# Altium footprint library C210_Rev_B_220601.PcbLib: 80 footprints (part 3 of 5)
Each footprint in its own frame and in the unit in brackets; x right, y up, seen from the top. Pads: shape width x height; smd on the part's side, far side on the other; paste and mask are expansions set on the pad; w line width, h text height; cw(c..) or ccw(c..) is an arc to the next point about the centre after c.
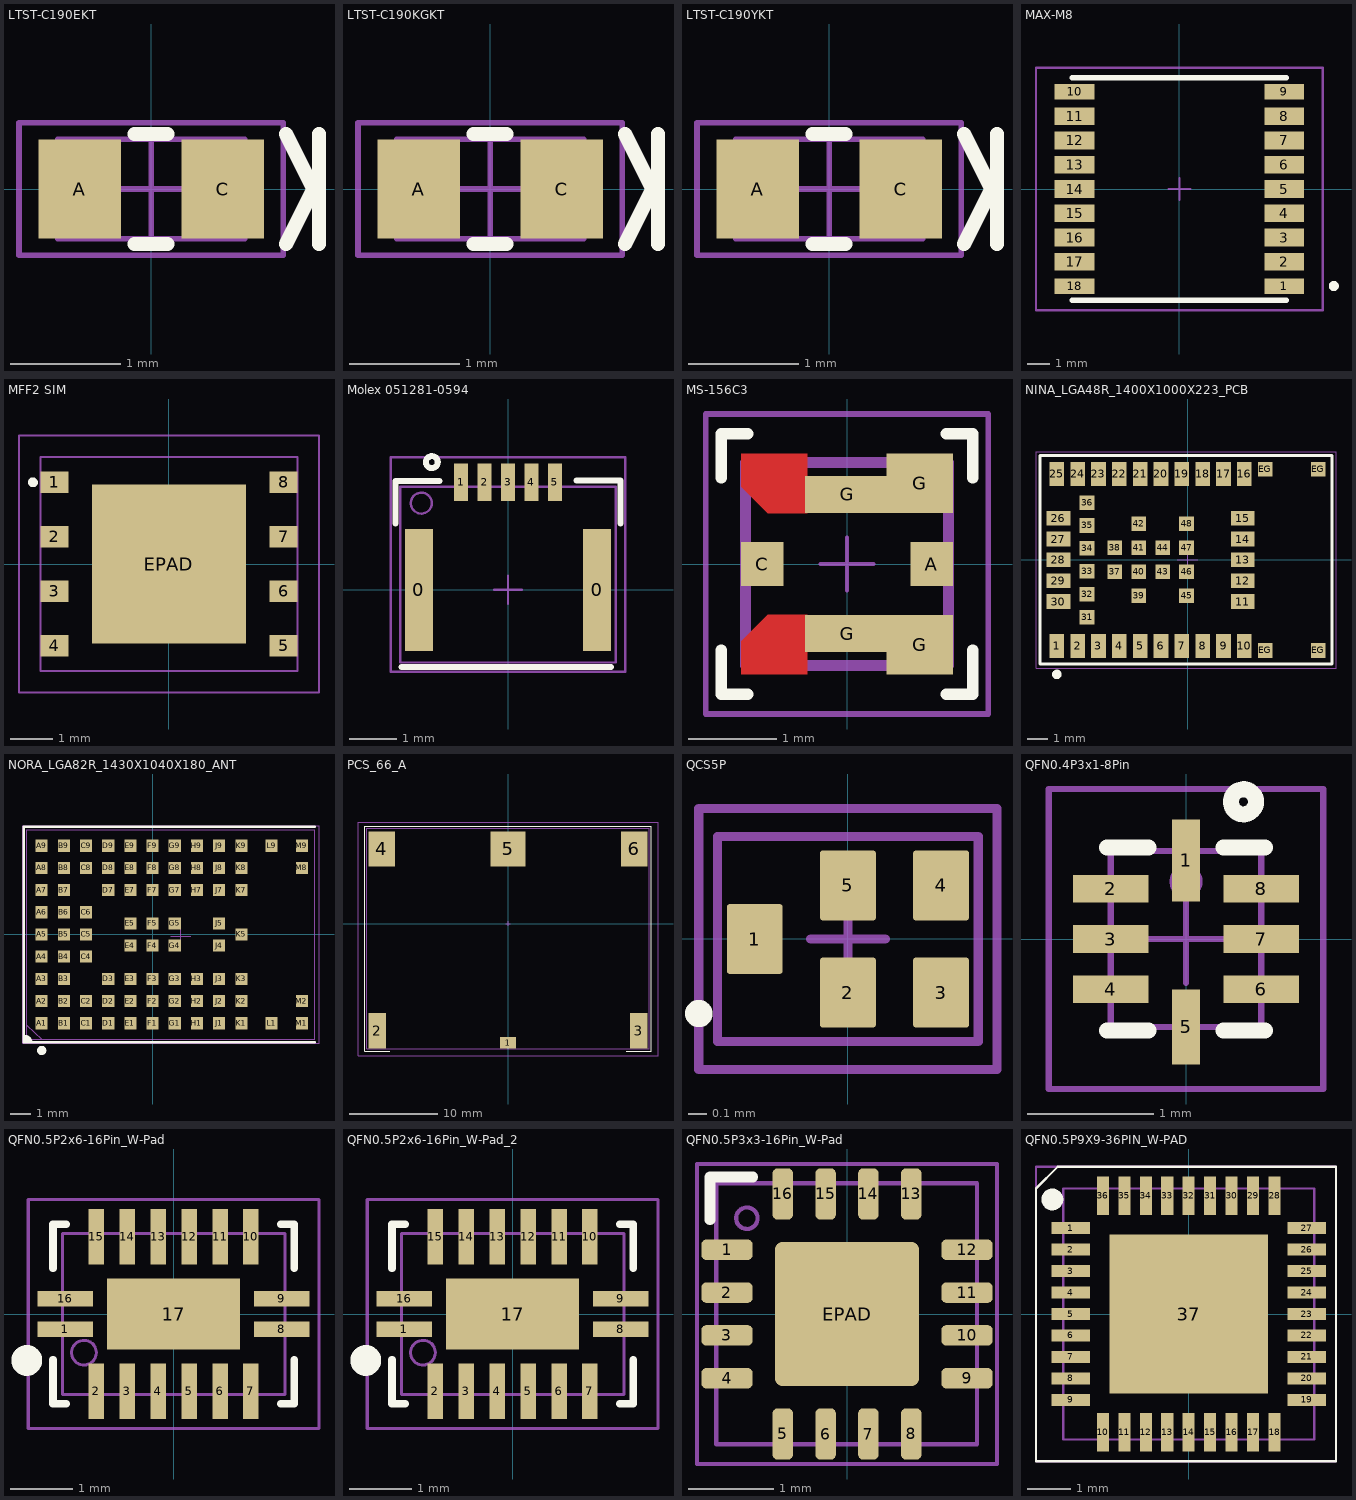
[diagram p2: the footprints below, top view; thin cyan lines are the x and y axes]

## LTST-C190EKT [mm]
pads (2):
  rect 0.75x0.9 smd: A(-0.65,0) C(0.65,0)
Top Overlay:
  lines w0.127: -0.15,-0.5 0.15,-0.5 ; -0.15,0.5 0.15,0.5 ; 1.225,-0.5 1.475,0 1.225,0.5 ; 1.525,-0.5 1.525,0.5
Mechanical 11:
  text ".Designator" at -1.075,-0.325 h0.5
Mechanical 13:
  lines w0.05: -0.85,-0.45 -0.85,0.45 0.85,0.45 0.85,-0.45 -0.85,-0.45
Mechanical 15:
  lines w0.05: -0.475,0 0.475,0 ; 0,-0.475 0,0.475 ; -1.2,-0.6 -1.2,0.6 1.2,0.6 1.2,-0.6 -1.2,-0.6
3D body "User Library-LTST-C190EKT.STEP": height 0.9, standoff 0, extent -0.85,-0.45 0.85,0.45

## LTST-C190KGKT [mm]
pads (2):
  rect 0.75x0.9 smd: A(-0.65,0) C(0.65,0)
Top Overlay:
  lines w0.127: -0.15,-0.5 0.15,-0.5 ; -0.15,0.5 0.15,0.5 ; 1.225,-0.5 1.475,0 1.225,0.5 ; 1.525,-0.5 1.525,0.5
Mechanical 11:
  text ".Designator" at 0.55,0.375 h0.5
Mechanical 13:
  lines w0.05: -0.85,-0.45 -0.85,0.45 0.85,0.45 0.85,-0.45 -0.85,-0.45
Mechanical 15:
  lines w0.05: -0.475,0 0.475,0 ; 0,-0.475 0,0.475 ; -1.2,-0.6 -1.2,0.6 1.2,0.6 1.2,-0.6 -1.2,-0.6
3D body "User Library-LTST-C190GKT.STEP": height 0.9, standoff 0, extent -0.85,-0.45 0.85,0.45

## LTST-C190YKT [mm]
pads (2):
  rect 0.75x0.9 smd: A(-0.65,0) C(0.65,0)
Top Overlay:
  lines w0.127: -0.15,-0.5 0.15,-0.5 ; -0.15,0.5 0.15,0.5 ; 1.225,-0.5 1.475,0 1.225,0.5 ; 1.525,-0.5 1.525,0.5
Mechanical 11:
  text ".Designator" at 0.625,0.2 h0.5
Mechanical 13:
  lines w0.05: -0.85,-0.45 -0.85,0.45 0.85,0.45 0.85,-0.45 -0.85,-0.45
Mechanical 15:
  lines w0.05: -0.475,0 0.475,0 ; 0,-0.475 0,0.475 ; -1.2,-0.6 -1.2,0.6 1.2,0.6 1.2,-0.6 -1.2,-0.6
3D body "User Library-LTST-C190YKT.STEP": height 0.9, standoff 0, extent -0.85,-0.45 0.85,0.45

## MAX-M8 [mm]
pads (18):
  rect 1.8x0.7 smd paste-10: 1(4.75,-4.4) 9(4.75,4.4) 10(-4.75,4.4) 18(-4.75,-4.4)
  rect 1.8x0.8 smd paste-10: 2(4.75,-3.3) 3(4.75,-2.2) 4(4.75,-1.1) 5(4.75,0) 6(4.75,1.1) 7(4.75,2.2) 8(4.75,3.3) 11(-4.75,3.3) 12(-4.75,2.2) 13(-4.75,1.1) 14(-4.75,0) 15(-4.75,-1.1) 16(-4.75,-2.2) 17(-4.75,-3.3)
Top Overlay:
  circle w0.254: c7,-4.4 r0.1
  lines w0.254: -4.85,-5.05 4.85,-5.05 ; -4.85,5.05 4.85,5.05
Top Paste:
  region: 6.25,2.9 6.25,3.7 4.85,3.7 4.85,3.6 3.95,3.6 3.95,3 4.85,3 4.85,2.9
  region: 6.25,1.8 6.25,2.6 4.85,2.6 4.85,2.5 3.95,2.5 3.95,1.9 4.85,1.9 4.85,1.8
  region: 6.25,0.7 6.25,1.5 4.85,1.5 4.85,1.4 3.95,1.4 3.95,0.8 4.85,0.8 4.85,0.7
  region: 6.25,-0.4 6.25,0.4 4.85,0.4 4.85,0.3 3.95,0.3 3.95,-0.3 4.85,-0.3 4.85,-0.4
  region: 6.25,-1.5 6.25,-0.7 4.85,-0.7 4.85,-0.8 3.95,-0.8 3.95,-1.4 4.85,-1.4 4.85,-1.5
  region: 6.25,-2.6 6.25,-1.8 4.85,-1.8 4.85,-1.9 3.95,-1.9 3.95,-2.5 4.85,-2.5 4.85,-2.6
  region: 6.25,-3.7 6.25,-2.9 4.85,-2.9 4.85,-3 3.95,-3 3.95,-3.6 4.85,-3.6 4.85,-3.7
  region: -6.25,-2.9 -6.25,-3.7 -4.85,-3.7 -4.85,-3.6 -3.95,-3.6 -3.95,-3 -4.85,-3 -4.85,-2.9
  region: -6.25,-1.8 -6.25,-2.6 -4.85,-2.6 -4.85,-2.5 -3.95,-2.5 -3.95,-1.9 -4.85,-1.9 -4.85,-1.8
  region: -6.25,-0.7 -6.25,-1.5 -4.85,-1.5 -4.85,-1.4 -3.95,-1.4 -3.95,-0.8 -4.85,-0.8 -4.85,-0.7
  region: -6.25,0.4 -6.25,-0.4 -4.85,-0.4 -4.85,-0.3 -3.95,-0.3 -3.95,0.3 -4.85,0.3 -4.85,0.4
  region: -6.25,1.5 -6.25,0.7 -4.85,0.7 -4.85,0.8 -3.95,0.8 -3.95,1.4 -4.85,1.4 -4.85,1.5
  region: -6.25,2.6 -6.25,1.8 -4.85,1.8 -4.85,1.9 -3.95,1.9 -3.95,2.5 -4.85,2.5 -4.85,2.6
  region: -6.25,3.7 -6.25,2.9 -4.85,2.9 -4.85,3 -3.95,3 -3.95,3.6 -4.85,3.6 -4.85,3.7
  region: -6.25,-4.05 -6.25,-4.75 -4.85,-4.75 -4.85,-4.65 -3.95,-4.65 -3.95,-4.15 -4.85,-4.15 -4.85,-4.05
  region: 6.25,-4.75 6.25,-4.05 4.85,-4.05 4.85,-4.15 3.95,-4.15 3.95,-4.65 4.85,-4.65 4.85,-4.75
  region: 6.25,4.05 6.25,4.75 4.85,4.75 4.85,4.65 3.95,4.65 3.95,4.15 4.85,4.15 4.85,4.05
  region: -6.25,4.75 -6.25,4.05 -4.85,4.05 -4.85,4.15 -3.95,4.15 -3.95,4.65 -4.85,4.65 -4.85,4.75
Mechanical 15:
  lines w0.1: -0.5,0 0,0 ; 0,-0.5 0,0 ; 0,0.5 0,0 ; 0.5,0 0,0 ; -6.5,-5.5 6.5,-5.5 6.5,5.5 -6.5,5.5 -6.5,-5.5
  text ".Designator" at 0.1,0.433 h1
3D body "User Library-MAX-M8 u-blox M8 Concurrent GNSS Module.step": height 2.51, standoff 0.01, extent -4.851,-5.05 4.851,5.05

## MFF2 SIM [mm]
pads (9):
  rect 0.65x0.5 smd mask+0.05: 1(-2.675,1.905) 2(-2.675,0.635) 3(-2.675,-0.635) 4(-2.675,-1.905) 5(2.675,-1.905) 6(2.675,-0.635) 7(2.675,0.635) 8(2.675,1.905)
  rect 3.6x3.7 smd mask+0.05: EPAD(0,0)
Top Overlay:
  circle w0.127: c-3.175,1.905 r0.05
Mechanical 11:
  text ".Designator" at 0.325,-0.95 h0.5
Mechanical 13:
  circle w0.05: c-2.54,1.905 r0.16
  lines w0.05: -3,-2.5 3,-2.5 3,2.5 -3,2.5 -3,-2.5
Mechanical 15:
  lines w0.05: -0.25,0 0.25,0 ; 0,-0.25 0,0.25 ; 0,-0.1 0,0.1 ; -3.5,-3 3.5,-3 3.5,3 -3.5,3 -3.5,-3
3D body "SIM-ST-MFF2--3DModel-STEP-56544.STEP": height 0.83, standoff 0.01, extent -3,-2.5 3,2.5

## Molex 051281-0594 [mm]
pads (7):
  rect 0.6x2.6 smd mask+0.05: 0(-1.9,0) 0(1.9,0)
  rect 0.3x0.8 smd mask+0.05: 1(-1,2.3) 2(-0.5,2.3) 3(0,2.3) 4(0.5,2.3) 5(1,2.3)
Top Overlay:
  circle w0.127: c-1.625,2.725 r0.127
  lines w0.127: -2.4,1.411 -2.4,2.325 -1.466,2.325 ; -2.275,-1.65 2.2,-1.65 ; 1.459,2.336 2.4,2.336 2.4,1.411
Mechanical 11:
  text "'.Designator'" at 0.275,-0.425 h0.5
Mechanical 13:
  circle w0.05: c-1.85,1.85 r0.224
  lines w0.05: -2.3,-1.55 -2.3,2.2 2.3,2.2 2.3,-1.55 -2.3,-1.55
Mechanical 15:
  lines w0.05: -0.3,0 0,0 ; 0.3,0 0,0 ; 0,0 0,0.3 0,-0.3 0,0 ; -2.5,-1.75 -2.5,2.825 2.5,2.825 2.5,-1.75 -2.5,-1.75
3D body "512810594.stp": height 1.2, standoff 0, extent -2.3,-1.55 2.3,2.5

## MS-156C3 [mm]
pads (6):
  rect 0.48x0.5 smd paste-10: A(0.96,0) C(-0.96,0)
  rect 0.95x0.42 smd paste-10 mask+0.102: G(0,-0.79) G(0,0.79)
  rect 0.75x0.67 smd paste-10 mask+0.102: G(0.825,-0.915) G(0.825,0.915)
Top Layer:
  region: -0.45,-0.575 -0.9,-0.575 -1.2,-0.875 -1.2,-1.25 -0.45,-1.25
  region: -0.45,0.575 -0.9,0.575 -1.2,0.875 -1.2,1.25 -0.45,1.25
Top Overlay:
  lines w0.127: -1.425,-0.975 -1.425,-1.475 -1.125,-1.475 ; -1.425,0.975 -1.425,1.475 -1.125,1.475 ; 1.125,-1.475 1.425,-1.475 1.425,-0.975 ; 1.125,1.475 1.425,1.475 1.425,0.975
Top Paste:
  region: 0.5,1.2 0.9,1.2 0.9,0.8 0.5,0.8
  region: 1.15,0.2 0.85,0.2 0.85,-0.2 1.15,-0.2
  region: -1.15,0.2 -0.85,0.2 -0.85,-0.2 -1.15,-0.2
  region: -0.275,0.95 0.225,0.95 0.225,0.65 -0.275,0.65
  region: -0.5,1.2 -0.9,1.2 -0.9,0.8 -0.5,0.8
  region: 0.5,-1.2 0.9,-1.2 0.9,-0.8 0.5,-0.8
  region: -0.275,-0.95 0.225,-0.95 0.225,-0.65 -0.275,-0.65
  region: -0.5,-1.2 -0.9,-1.2 -0.9,-0.8 -0.5,-0.8
Top Solder:
  region: -1,0.475 -1.3,0.775 -1.3,1.35 -0.35,1.35 -0.35,0.475
  region: -1.3,0 -1.3,0.8 1.3,0.8 1.3,0
  region: -1,-0.475 -1.3,-0.775 -1.3,-1.35 -0.35,-1.35 -0.35,-0.475
  region: -1.3,0 -1.3,-0.8 1.3,-0.8 1.3,0
Mechanical 11:
  text ".Designator" at 0.895,-0.004 h0.5
Mechanical 13:
  lines w0.127: -1.15,-1.15 1.15,-1.15 1.15,1.15 -1.15,1.15 -1.15,-1.15
Mechanical 15:
  lines w0.05: -0.3,0 0.3,0 ; 0,-0.3 0,0.3
  lines w0.064: -1.6,-1.7 1.6,-1.7 1.6,1.7 -1.6,1.7 -1.6,-1.7
3D body "MS-156C3.stp": height 1.36, standoff 0.01, extent -1.15,-1.15 1.15,1.15

## NINA_LGA48R_1400X1000X223_PCB [mm]
pads (52):
  rect 0.7x1.15 smd paste+0 mask+0.05: 1(-6.275,-4.125) 2(-5.275,-4.125) 3(-4.275,-4.125) 4(-3.275,-4.125) 5(-2.275,-4.125) 6(-1.275,-4.125) 7(-0.275,-4.125) 8(0.725,-4.125) 9(1.725,-4.125) 10(2.725,-4.125) 16(2.725,4.125) 17(1.725,4.125) 18(0.725,4.125) 19(-0.275,4.125) 20(-1.275,4.125) 21(-2.275,4.125) 22(-3.275,4.125) 23(-4.275,4.125) 24(-5.275,4.125) 25(-6.275,4.125)
  rect 1.15x0.7 smd paste+0 mask+0.05: 11(2.65,-2) 12(2.65,-1) 13(2.65,0) 14(2.65,1) 15(2.65,2) 26(-6.2,2) 27(-6.2,1) 28(-6.2,0) 29(-6.2,-1) 30(-6.2,-2)
  rect 0.7x0.7 smd paste+0 mask+0.05: 31(-4.825,-2.75) 32(-4.825,-1.65) 33(-4.825,-0.55) 34(-4.825,0.55) 35(-4.825,1.65) 36(-4.825,2.75) 37(-3.5,-0.575) 38(-3.5,0.575) 39(-2.35,-1.725) 40(-2.35,-0.575) 41(-2.35,0.575) 42(-2.35,1.725) 43(-1.2,-0.575) 44(-1.2,0.575) 45(-0.05,-1.725) 46(-0.05,-0.575) 47(-0.05,0.575) 48(-0.05,1.725) EG(3.725,-4.35) EG(3.725,4.35) EG(6.275,-4.35) EG(6.275,4.35)
Top Overlay:
  circle w0.254: c-6.275,-5.5 r0.1
  lines w0.15: -7.075,-5 6.925,-5 6.925,5 -7.075,5 -7.075,-5
Mechanical 13:
  lines w0.1: -7.075,-5 6.925,-5 6.925,5 -7.075,5 -7.075,-5
Mechanical 15:
  lines w0.05: -0.5,0 0.5,0 ; 0,-0.5 0,0.5 ; -7.275,-5.2 7.125,-5.2 7.125,5.2 -7.275,5.2 -7.275,-5.2
  text ".Designator" at 0.1,0.433 h1
Multi-Layer:
  pour cut-out: 3.825,4 6.925,4 6.925,-4 3.825,-4
3D body "NINA-W1x6.STEP": height 2.25, standoff -0.01, extent -7.075,-5 6.925,5

## NORA_LGA82R_1430X1040X180_ANT [mm]
pads (82):
  rect 0.6x0.6 smd: A1(-5.5,-4.4) A2(-5.5,-3.3) A3(-5.5,-2.2) A4(-5.5,-1.1) A5(-5.5,0) A6(-5.5,1.1) A7(-5.5,2.2) A8(-5.5,3.3) A9(-5.5,4.4) B1(-4.4,-4.4) B2(-4.4,-3.3) B3(-4.4,-2.2) B4(-4.4,-1.1) B5(-4.4,0) B6(-4.4,1.1) B7(-4.4,2.2) B8(-4.4,3.3) B9(-4.4,4.4) C1(-3.3,-4.4) C2(-3.3,-3.3) C4(-3.3,-1.1) C5(-3.3,0) C6(-3.3,1.1) C8(-3.3,3.3) C9(-3.3,4.4) D1(-2.2,-4.4) D2(-2.2,-3.3) D3(-2.2,-2.2) D7(-2.2,2.2) D8(-2.2,3.3) D9(-2.2,4.4) E1(-1.1,-4.4) E2(-1.1,-3.3) E3(-1.1,-2.2) E4(-1.1,-0.55) E5(-1.1,0.55) E7(-1.1,2.2) E8(-1.1,3.3) E9(-1.1,4.4) F1(0,-4.4) F2(0,-3.3) F3(0,-2.2) F4(0,-0.55) F5(0,0.55) F7(0,2.2) F8(0,3.3) F9(0,4.4) G1(1.1,-4.4) G2(1.1,-3.3) G3(1.1,-2.2) G4(1.1,-0.55) G5(1.1,0.55) G7(1.1,2.2) G8(1.1,3.3) G9(1.1,4.4) H1(2.2,-4.4) H2(2.2,-3.3) H3(2.2,-2.2) H7(2.2,2.2) H8(2.2,3.3) H9(2.2,4.4) J1(3.3,-4.4) J2(3.3,-3.3) J3(3.3,-2.2) J4(3.3,-0.55) J5(3.3,0.55) J7(3.3,2.2) J8(3.3,3.3) J9(3.3,4.4) K1(4.4,-4.4) K2(4.4,-3.3) K3(4.4,-2.2) K5(4.4,0) K7(4.4,2.2) K8(4.4,3.3) K9(4.4,4.4) L1(5.9,-4.4) L9(5.9,4.4) M1(7.4,-4.4) M2(7.4,-3.3) M8(7.4,3.3) M9(7.4,4.4)
Top Overlay:
  circle w0.254: c-5.5,-5.75 r0.1
  lines w0.127: 8.05,-5.35 -6.4,-5.35 -6.4,5.35 8.05,5.35
  lines w0.128: -6.343,-5.194 -6.193,-5.344 ; -6.3,-5.15 cw(c-6.3,-5.3) -6.15,-5.3 ; -6.3,-5.05 cw(c-6.325,-5.349) -6.025,-5.349
Mechanical 11:
  text ".Designator" at -1.075,-0.775 h0.5
Mechanical 13:
  lines w0.05: -6.25,-4.5 -5.5,-5.2 ; -6.25,-5.2 -6.25,5.2 8.05,5.2 8.05,-5.2 -6.25,-5.2
Mechanical 15:
  lines w0.05: 0.9,-0.1 1.9,-0.1 ; 1.4,-0.6 1.4,0.4 ; -6.45,-5.4 8.25,-5.4 8.25,5.4 -6.45,5.4 -6.45,-5.4
Multi-Layer:
  pour cut-out: 7.1,-4.1 7.1,-3.001 7.9,-2.998 7.9,-5.225 8.25,-5.225 8.25,5.325 7.9,5.325 7.9,3 7.1,3 7.1,4.1 4.7,4.1 4.7,-4.1
3D body "NORA-B506_v1.step": height 1.78, standoff -0.01, extent -6.25,-5.2 8.05,5.2

## PCS_66_A [mm]
pads (6):
  rect 1.85x1.3 smd paste-0.1: 1(0,-13.5)
  rect 2x4 smd paste-0.2: 2(-14.8,-12.15) 3(14.8,-12.15)
  rect 3x4 smd paste-0.25: 4(-14.3,8.45) 6(14.3,8.45)
  rect 4x4 smd paste-0.3: 5(0,8.45)
Top Overlay:
  lines w0.127: -13.4,-14.45 -16.25,-14.45 -16.25,11.05 16.25,11.05 16.25,-14.45 13.4,-14.45
Mechanical 11:
  text ".Designator" at 0.127,0.294 h0.5
Mechanical 13:
  lines w0.127: -16,-14.2 16,-14.2 16,10.8 -16,10.8 -16,-14.2
Mechanical 15:
  lines w0.05: -0.25,0 0.25,0 ; 0,-0.25 0,0.25 ; 0,-0.1 0,0.1 ; -17,-15 17,-15 17,11.5 -17,11.5 -17,-15
3D body "PCS66A.step": height 1.71, standoff 0.01, extent -16.003,-14.351 16.003,10.659

## QCS5P [mm]
pads (5):
  rrect10% 0.3x0.375 smd mask+0.05: 1(-0.5,0) 2(0,-0.288) 3(0.5,-0.288) 4(0.5,0.288) 5(0,0.287)
Top Overlay:
  circle w0.127: c-0.8,-0.4 r0.01
Mechanical 11:
  text ".Designator" at 0.325,-0.7 h0.5
Mechanical 13:
  lines w0.05: -0.7,-0.55 -0.7,0.55 0.7,0.55 0.7,-0.55 -0.7,-0.55
Mechanical 15:
  lines w0.05: -0.2,0 0.2,0 ; 0,-0.2 0,0.2 ; -0.8,-0.7 -0.8,0.7 0.8,0.7 0.8,-0.7 -0.8,-0.7
3D body "User Library-kyocera-sf14.step": height 0.7, standoff 0, extent -0.7,-0.55 0.7,0.55

## QFN0.4P3x1-8Pin [mm]
pads (8):
  rect 0.22x0.65 smd: 1(0,0.625)
  rect 0.6x0.22 smd: 2(-0.6,0.4) 3(-0.6,0) 4(-0.6,-0.4) 6(0.6,-0.4) 7(0.6,0) 8(0.6,0.4)
  rect 0.22x0.6 smd: 5(0,-0.7)
Top Overlay:
  circle w0.127: c0.457,1.092 r0.1
  lines w0.127: -0.63,-0.73 -0.3,-0.73 ; -0.63,0.73 -0.3,0.73 ; 0.3,-0.73 0.63,-0.73 ; 0.3,0.73 0.63,0.73
Mechanical 11:
  text ".Designator" at -0.254,0.738 h0.5
Mechanical 13:
  circle w0.05: c0,0.457 r0.108
  lines w0.05: -0.6,-0.7 -0.6,0.7 0.6,0.7 0.6,-0.7 -0.6,-0.7
Mechanical 15:
  lines w0.05: -0.35,0 0.35,0 ; 0,-0.35 0,0.35 ; -1.092,-1.194 1.092,-1.194 1.092,1.194 -1.092,1.194 -1.092,-1.194
3D body: height 0.5, standoff 0, extent -0.65,-0.75 0.65,0.75

## QFN0.5P2x6-16Pin_W-Pad [mm]
pads (17):
  rect 0.9x0.25 smd paste-0.025 mask+0.05: 1(-1.75,-0.25) 8(1.75,-0.25) 9(1.75,0.25) 16(-1.75,0.25)
  rect 0.25x0.9 smd paste-0.025 mask+0.05: 2(-1.25,-1.25) 3(-0.75,-1.25) 4(-0.25,-1.25) 5(0.25,-1.25) 6(0.75,-1.25) 7(1.25,-1.25) 10(1.25,1.25) 11(0.75,1.25) 12(0.25,1.25) 13(-0.25,1.25) 14(-0.75,1.25) 15(-1.25,1.25)
  rect 2.15x1.15 smd paste-3 mask+0.05: 17(0,0)
Top Overlay:
  circle w0.25: c-2.375,-0.75 r0.125
  lines w0.127: -1.95,-0.738 -1.95,-1.45 -1.739,-1.45 ; -1.95,0.738 -1.95,1.45 -1.739,1.45 ; 1.739,-1.45 1.95,-1.45 1.95,-0.738 ; 1.739,1.45 1.95,1.45 1.95,0.738
Top Paste:
  rectangle: -0.55,-0.2 -0.15,0.2
  rectangle: 0.15,-0.2 0.55,0.2
Mechanical 11:
  text ".Designator" at 0.347,0.175 h0.5
Mechanical 13:
  circle w0.05: c-1.45,-0.625 r0.2
  lines w0.05: -1.8,-1.3 1.8,-1.3 1.8,1.3 -1.8,1.3 -1.8,-1.3
Mechanical 15:
  lines w0.05: -2.35,-1.85 2.35,-1.85 2.35,1.85 -2.35,1.85 -2.35,-1.85
  lines w0.1: -0.5,0 0.5,0 ; 0,-0.5 0,0.5
3D body: height 1, standoff 0, extent -1.8,-1.3 1.8,1.3

## QFN0.5P2x6-16Pin_W-Pad_2 [mm]
pads (17):
  rect 0.9x0.25 smd paste-0.025 mask+0.05: 1(-1.75,-0.25) 8(1.75,-0.25) 9(1.75,0.25) 16(-1.75,0.25)
  rect 0.25x0.9 smd paste-0.025 mask+0.05: 2(-1.25,-1.25) 3(-0.75,-1.25) 4(-0.25,-1.25) 5(0.25,-1.25) 6(0.75,-1.25) 7(1.25,-1.25) 10(1.25,1.25) 11(0.75,1.25) 12(0.25,1.25) 13(-0.25,1.25) 14(-0.75,1.25) 15(-1.25,1.25)
  rect 2.15x1.15 smd paste-3 mask+0.05: 17(0,0)
Top Overlay:
  circle w0.25: c-2.375,-0.75 r0.125
  lines w0.127: -1.95,-0.739 -1.95,-1.45 -1.739,-1.45 ; -1.95,0.738 -1.95,1.45 -1.739,1.45 ; 1.739,-1.45 1.95,-1.45 1.95,-0.739 ; 1.739,1.45 1.95,1.45 1.95,0.739
Top Paste:
  rectangle: 0.15,-0.2 0.55,0.2
  rectangle: -0.55,-0.2 -0.15,0.2
Mechanical 11:
  text ".Designator" at 0.586,0.317 h0.5
Mechanical 13:
  circle w0.05: c-1.45,-0.625 r0.2
  lines w0.05: -1.8,-1.3 -1.8,1.3 1.8,1.3 1.8,-1.3 -1.8,-1.3
Mechanical 15:
  lines w0.05: -2.35,-1.85 -2.35,1.85 2.35,1.85 2.35,-1.85 -2.35,-1.85
  lines w0.1: -0.5,0 0.5,0 ; 0,-0.5 0,0.5
3D body: height 1, standoff 0, extent -1.8,-1.3 1.8,1.3

## QFN0.5P3x3-16Pin_W-Pad [mm]
pads (17):
  rrect50% 0.6x0.24 smd: 1(-1.4,0.75) 2(-1.4,0.25) 3(-1.4,-0.25) 4(-1.4,-0.75) 9(1.4,-0.75) 10(1.4,-0.25) 11(1.4,0.25) 12(1.4,0.75)
  rrect50% 0.24x0.6 smd: 5(-0.75,-1.4) 6(-0.25,-1.4) 7(0.25,-1.4) 8(0.75,-1.4) 13(0.75,1.4) 14(0.25,1.4) 15(-0.25,1.4) 16(-0.75,1.4)
  rrect10% 1.68x1.68 smd: EPAD(0,0)
Top Overlay:
  lines w0.127: -1.6,1.1 -1.6,1.6 -1.1,1.6
Mechanical 11:
  text ".Designator" at 0.393,0.248 h0.5
Mechanical 13:
  circle w0.05: c-1.168,1.118 r0.125
  lines w0.05: -1.524,-1.521 1.518,-1.521 1.518,1.524 -1.524,1.524 -1.524,-1.521
Mechanical 15:
  lines w0.05: -0.35,0 0.35,0 ; 0,-0.35 0,0.35 ; -1.75,-1.75 -1.75,1.75 1.75,1.75 1.75,-1.75 -1.75,-1.75
3D body "ALSRobot-QFN16 3x3.STEP": height 0.9, standoff 0, extent -1.524,-1.521 1.518,1.521

## QFN0.5P9X9-36PIN_W-PAD [mm]
pads (37):
  rect 0.9x0.28 smd: 1(-2.75,2) 2(-2.75,1.5) 3(-2.75,1) 4(-2.75,0.5) 5(-2.75,0) 6(-2.75,-0.5) 7(-2.75,-1) 8(-2.75,-1.5) 9(-2.75,-2) 19(2.75,-2) 20(2.75,-1.5) 21(2.75,-1) 22(2.75,-0.5) 23(2.75,0) 24(2.75,0.5) 25(2.75,1) 26(2.75,1.5) 27(2.75,2)
  rect 0.28x0.9 smd: 10(-2,-2.75) 11(-1.5,-2.75) 12(-1,-2.75) 13(-0.5,-2.75) 14(0,-2.75) 15(0.5,-2.75) 16(1,-2.75) 17(1.5,-2.75) 18(2,-2.75) 28(2,2.75) 29(1.5,2.75) 30(1,2.75) 31(0.5,2.75) 32(0,2.75) 33(-0.5,2.75) 34(-1,2.75) 35(-1.5,2.75) 36(-2,2.75)
  rect 3.7x3.7 smd: 37(0,0)
Top Overlay:
  circle w0.254: c-3.175,2.667 r0.127
  lines w0.05: -3.556,-3.429 -3.556,2.921 -3.048,3.429 3.429,3.429 3.429,-3.429 -3.556,-3.429
Mechanical 11:
  text ".Designator" at 0.172,-0.85 h0.5
Mechanical 13:
  lines w0.05: -2.921,-2.921 -2.921,2.921 2.921,2.921 2.921,-2.921 -2.921,-2.921
Mechanical 15:
  lines w0.05: -0.254,0 0.254,0 ; 0,-0.254 0,0.254 ; -3.556,-3.429 -3.556,3.429 -0.127,3.429 3.429,3.429 3.429,-3.429 -3.556,-3.429
3D body "ALSRobot-QFN36 6x6.step": height 0.91, standoff 0.01, extent -3.102,-3.103 3.103,3.102